# Altium footprint library MU_MP_39_V1.PcbLib: 76 footprints (part 5 of 5)
Each footprint in its own frame and in the unit in brackets; x right, y up, seen from the top. Pads: shape width x height; smd on the part's side, far side on the other; paste and mask are expansions set on the pad; w line width, h text height; cw(c..) or ccw(c..) is an arc to the next point about the centre after c.
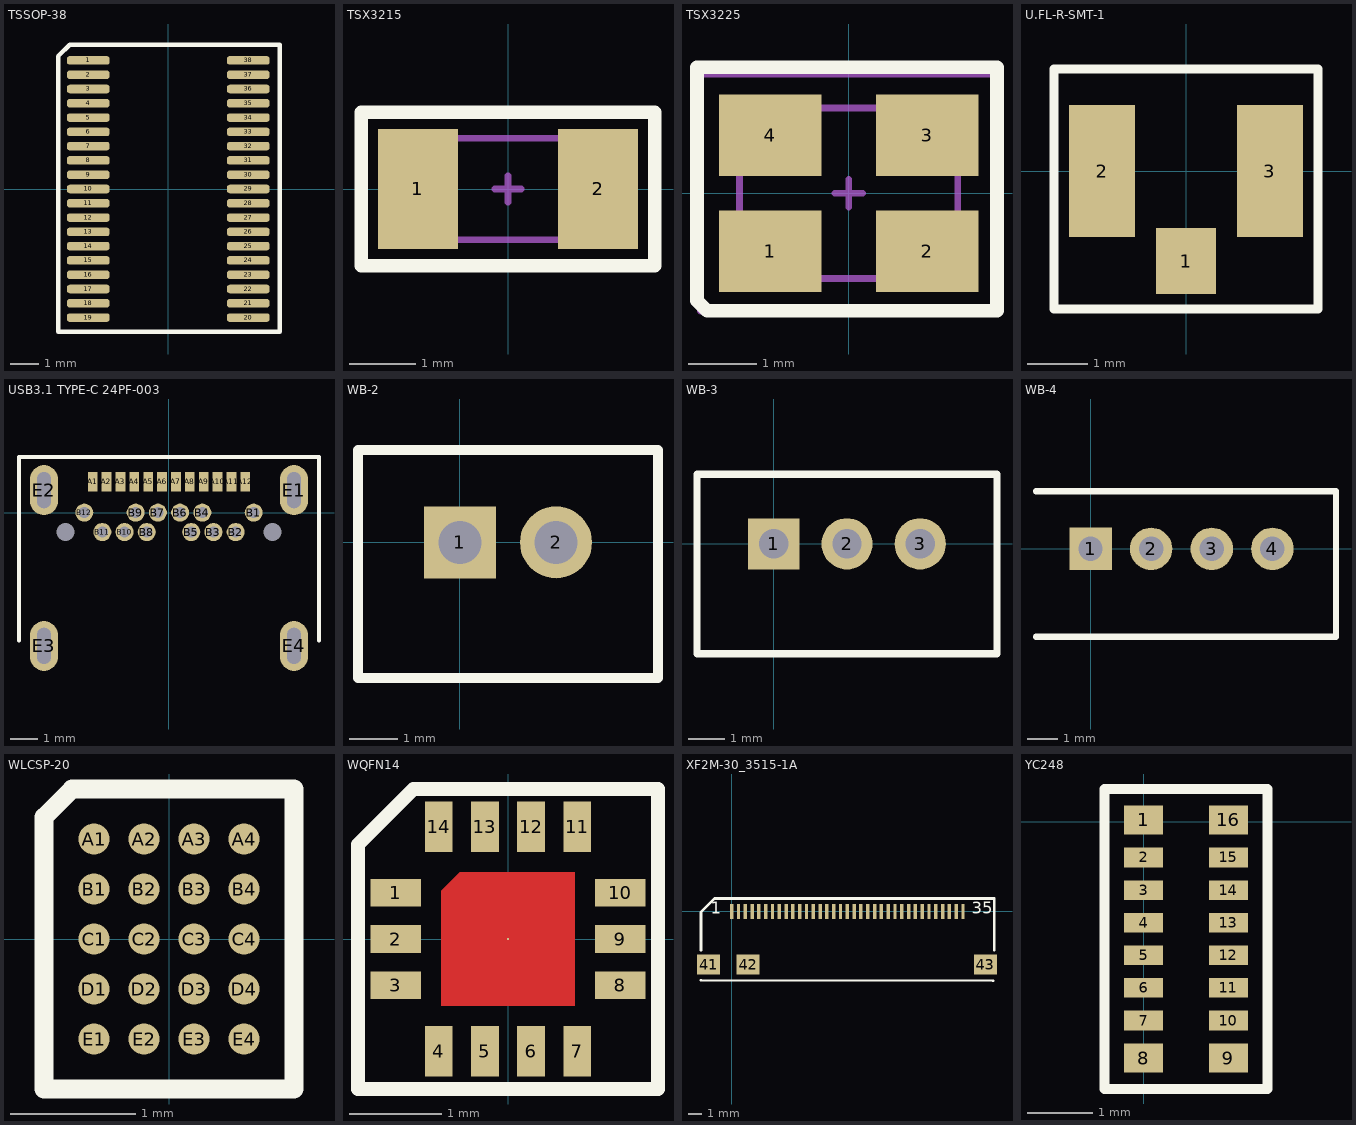
[diagram p4: the footprints below, top view; thin cyan lines are the x and y axes]

## TSSOP-38 [mm]
pads (38):
  rrect70% 1.5x0.3 smd: 1(-2.8,4.5) 2(-2.8,4) 3(-2.8,3.5) 4(-2.8,3) 5(-2.8,2.5) 6(-2.8,2) 7(-2.8,1.5) 8(-2.8,1) 9(-2.8,0.5) 10(-2.8,0) 11(-2.8,-0.5) 12(-2.8,-1) 13(-2.8,-1.5) 14(-2.8,-2) 15(-2.8,-2.5) 16(-2.8,-3) 17(-2.8,-3.5) 18(-2.8,-4) 19(-2.8,-4.5) 20(2.8,-4.5) 21(2.8,-4) 22(2.8,-3.5) 23(2.8,-3) 24(2.8,-2.5) 25(2.8,-2) 26(2.8,-1.5) 27(2.8,-1) 28(2.8,-0.5) 29(2.8,0) 30(2.8,0.5) 31(2.8,1) 32(2.8,1.5) 33(2.8,2) 34(2.8,2.5) 35(2.8,3) 36(2.8,3.5) 37(2.8,4) 38(2.8,4.5)
Top Overlay:
  lines w0.15: -3.85,-5 3.9,-5 3.9,5.05 -3.45,5.05 -3.85,4.65 -3.85,-5
Top Solder:
  rectangle: 1.998,-4.5 3.598,4.5
  rectangle: -3.6,-4.5 -2,4.5
Mechanical 15:
  lines w0.1: -3.85,-5 -3.85,4.65 -3.45,5.05 3.9,5.05 3.9,-5 -3.85,-5
3D body "User Library-TSSOP-38-1.STEP": height 1.2, standoff 0, extent -3.2,-4.85 3.2,4.85

## TSX3215 [mm]
pads (2):
  rect 1.2x1.8 smd: 1(-1.35,0) 2(1.35,0)
Top Overlay:
  lines w0.2: -2.2,-1.15 -2.2,1.15 2.2,1.15 2.2,-1.15 -2.2,-1.15
Mechanical 1:
  lines w0.1: -1.61,-0.76 1.61,-0.76 1.61,0.76 -1.61,0.76 -1.61,-0.76
Mechanical 15:
  lines w0.1: -0.2,0 0.2,0 ; 0,-0.2 0,0.2 ; -2.2,-1.15 -2.2,1.15 2.2,1.15 2.2,-1.15 -2.2,-1.15
3D body "User Library-ABS07.STEP": height 0.91, standoff 0, extent -1.61,-0.76 1.61,0.76

## TSX3225 [mm]
pads (4):
  rect 1.5x1.2 smd: 1(-1.15,-0.85) 2(1.15,-0.85) 3(1.15,0.85) 4(-1.15,0.85)
Top Overlay:
  lines w0.2: -2.225,-1.575 -2.075,-1.725 2.175,-1.725 2.175,1.85 -2.225,1.85 -2.225,-1.575
Mechanical 1:
  lines w0.1: -1.6,-1.25 -1.6,1.25 1.6,1.25 1.6,-1.25 -1.6,-1.25
Mechanical 15:
  lines w0.1: -0.2,0 0.2,0 ; 0,-0.2 0,0.2 ; -2.175,-1.725 -2.175,1.75 1.625,1.75 2.175,1.75 2.175,-1.725 -2.175,-1.725
3D body "User Library-User Library-Siward_SX3225.step": height 0.81, standoff 0, extent -1.6,-1.25 1.6,1.25

## U.FL-R-SMT-1 [mm]
pads (3):
  rect 1x1.1 smd: 1(0,-1.5)
  rect 1.1x2.2 smd: 2(-1.4,0) 3(1.4,0)
Top Overlay:
  lines w0.15: -2.2,-2.3 -2.2,1.7 2.2,1.7 2.2,-2.3 -2.2,-2.3
3D body "User Library-U_FL-R-SMT-1.STEP": height 1.25, standoff -0.01, extent -1.529,-1.595 1.471,1.505

## USB3.1 TYPE-C 24PF-003 [mm]
pads (30):
  rect 0.35x0.7 smd mask+0.05: A1(-2.75,1.11) A2(-2.25,1.11) A3(-1.75,1.11) A4(-1.25,1.11) A5(-0.75,1.11) A6(-0.25,1.11) A7(0.25,1.11) A8(0.75,1.11) A9(1.25,1.11) A10(1.75,1.11) A11(2.25,1.11) A12(2.75,1.11)
  round 0.65 hole 0.4 mask+0.05: B1(3.05,0) B2(2.4,-0.7) B3(1.6,-0.7) B4(1.2,0) B5(0.8,-0.7) B6(0.4,0) B7(-0.4,0) B8(-0.8,-0.7) B9(-1.2,0) B10(-1.6,-0.7) B11(-2.4,-0.7) B12(-3.05,0)
  oval 1x1.8 hole 0.5 slot 1.3 at 90 deg mask+0.05: E1(4.5,0.81) E2(-4.5,0.81) E3(-4.5,-4.8) E4(4.5,-4.8)
  round 0 hole 0.65 mask+0.05: H1(-3.725,-0.7) H2(3.725,-0.7)
Top Overlay:
  lines w0.15: -5.4,-4.6 -5.4,2 5.4,2 5.4,-4.6
Top Solder:
  rectangle: -2.817,0.71 2.868,1.51
Multi-Layer:
  pour cut-out: 3.149,-0.7 3.149,-0.814 3.237,-1.026 3.399,-1.188 3.611,-1.276 3.725,-1.276 3.839,-1.276 4.051,-1.188 4.213,-1.026 4.301,-0.814 4.301,-0.7 4.301,-0.586 4.213,-0.374 4.051,-0.212 3.839,-0.124 3.725,-0.124 3.611,-0.124 3.399,-0.212 3.237,-0.374 3.149,-0.586
  pour cut-out: -3.725,-1.276 -3.839,-1.276 -4.051,-1.188 -4.213,-1.026 -4.301,-0.814 -4.301,-0.7 -4.301,-0.586 -4.213,-0.374 -4.051,-0.212 -3.839,-0.124 -3.725,-0.124 -3.611,-0.124 -3.399,-0.212 -3.237,-0.374 -3.149,-0.586 -3.149,-0.7 -3.149,-0.814 -3.237,-1.026 -3.399,-1.188 -3.611,-1.276
3D body "usb4055-30-a.stp": height 3.51, standoff -1.15, extent -4.862,-8.455 4.849,1.545

## WB-2 [mm]
pads (2):
  rect 1.5x1.5 hole 0.9: 1(0,0)
  round 1.5 hole 0.9: 2(2,0)
Top Overlay:
  lines w0.2: -2.125,-2.825 -2.125,1.925 0.775,1.925 4.125,1.925 4.125,-2.825 -2.125,-2.825
Mechanical 15:
  lines w0.1: -2.125,-2.825 -2.125,1.925 0.775,1.925 4.125,1.925 4.125,-2.825 -2.125,-2.825
3D body "User Library-mw-2m-1.STEP": height 6.05, standoff -3.15, extent -2,-2.7 4,1.8

## WB-3 [mm]
pads (3):
  rect 1.4x1.4 hole 0.8: 1(0,0)
  round 1.4 hole 0.8: 2(2,0) 3(4,0)
Top Overlay:
  lines w0.2: -2.1,-3 6.1,-3 6.1,1.9 0.8,1.9 -2.1,1.9 -2.1,-3
3D body "DS1066-03M.STEP": height 6, standoff -3.3, extent -1.95,-2.8 5.95,1.7

## WB-4 [mm]
pads (4):
  rect 1.4x1.4 hole 0.8: 1(0,0)
  round 1.4 hole 0.8: 2(2,0) 3(4,0) 4(6,0)
Top Overlay:
  lines w0.2: -1.8,-2.9 8.1,-2.9 8.1,1.9 0.8,1.9 -1.8,1.9
3D body "User Library-BxB-PH.STEP": height 6, standoff -3.3, extent -1.95,-2.75 7.95,1.75

## WLCSP-20 [mm]
pads (20):
  round 0.25 smd mask+0.04: A1(-0.6,0.8) A2(-0.2,0.8) A3(0.2,0.8) A4(0.6,0.8) B1(-0.6,0.4) B2(-0.2,0.4) B3(0.2,0.4) B4(0.6,0.4) C1(-0.6,0) C2(-0.2,0) C3(0.2,0) C4(0.6,0) D1(-0.6,-0.4) D2(-0.2,-0.4) D3(0.2,-0.4) D4(0.6,-0.4) E1(-0.6,-0.8) E2(-0.2,-0.8) E3(0.2,-0.8) E4(0.6,-0.8)
Top Overlay:
  lines w0.15: -1,-1.2 1,-1.2 1,1.2 -0.775,1.2 -1,0.975 -1,-1.2
3D body "User Library-WLCSP-20 v1.STEP": height 0.58, standoff -0.03, extent -0.815,-0.998 0.785,1.002

## WQFN14 [mm]
pads (15):
  rect 0.55x0.3 smd: 1(-1.215,0.5) 2(-1.215,0) 3(-1.215,-0.5) 8(1.215,-0.5) 9(1.215,0) 10(1.215,0.5)
  rect 0.3x0.55 smd: 4(-0.75,-1.215) 5(-0.25,-1.215) 6(0.25,-1.215) 7(0.75,-1.215) 11(0.75,1.215) 12(0.25,1.215) 13(-0.25,1.215) 14(-0.75,1.215)
  round 0.025 smd mask+0.05: 15(0,0)
Top Layer:
  region: -0.525,0.725 -0.725,0.525 -0.725,-0.725 0.725,-0.725 0.725,0.725
Top Overlay:
  lines w0.15: -1.625,-1.625 -1.625,0.525 -1.625,1.025 -1.025,1.625 1.625,1.625 1.625,-1.625 -1.625,-1.625
3D body "User Library-MLP14_2P5X2P5_ONS.STEP": height 0.51, standoff 0, extent -1.245,-1.245 1.245,1.245

## XF2M-30_3515-1A [mm]
pads (38):
  rect 0.25x1.1 smd: 1(0,0) 2(0.5,0) 3(1,0) 4(1.5,0) 5(2,0) 6(2.5,0) 7(3,0) 8(3.5,0) 9(4,0) 10(4.5,0) 11(5,0) 12(5.5,0) 13(6,0) 14(6.5,0) 15(7,0) 16(7.5,0) 17(8,0) 18(8.5,0) 19(9,0) 20(9.5,0) 21(10,0) 22(10.5,0) 23(11,0) 24(11.5,0) 25(12,0) 26(12.5,0) 27(13,0) 28(13.5,0) 29(14,0) 30(14.5,0) 31(15,0) 32(15.5,0) 33(16,0) 34(16.5,0) 35(17,0)
  rect 1.7x1.5 smd: 41(-1.7,-3.9) 42(1.2,-3.9) 43(18.65,-3.9)
Top Overlay:
  lines w0.2: -2.25,-5.05 19.2,-5.1 ; -2.25,-2.85 -2.25,-0.05 -1.25,0.95 19.3,0.95 19.3,-2.85
  text "35" at 17.65,-0.45 h1.5
  text "1" at -1.55,-0.45 h1.5
3D body "xf2m-3515-1a.stp": height 2.01, standoff 0.01, extent -2.3,-5 19.3,0.9

## YC248 [mm]
pads (16):
  rect 0.6x0.45 smd: 1(0,0.025) 8(0,-3.625) 9(1.3,-3.625) 16(1.3,0.025)
  rect 0.6x0.3 smd: 2(0,-0.55) 3(0,-1.05) 4(0,-1.55) 5(0,-2.05) 6(0,-2.55) 7(0,-3.05) 10(1.3,-3.05) 11(1.3,-2.55) 12(1.3,-2.05) 13(1.3,-1.55) 14(1.3,-1.05) 15(1.3,-0.55)
Top Overlay:
  lines w0.15: -0.6,-4.1 -0.6,0.5 1.9,0.5 1.9,-4.1 -0.6,-4.1
Top Solder:
  region: 0.9,0.35 1.7,0.35 1.7,-3.95 0.9,-3.95
  region: -0.4,0.35 0.4,0.35 0.4,-3.95 -0.4,-3.95
Mechanical 15:
  lines w0.1: -0.6,-4.1 -0.6,0.1 -0.6,0.5 1.9,0.5 1.9,-4.1 -0.6,-4.1
3D body "User Library-YC248.STEP": height 0.45, standoff 0, extent -0.15,-3.8 1.45,0.2